# Altium footprint library General.PcbLib: 246 footprints (part 7 of 16)
Each footprint in its own frame and in the unit in brackets; x right, y up, seen from the top. Pads: shape width x height; smd on the part's side, far side on the other; paste and mask are expansions set on the pad; w line width, h text height; cw(c..) or ccw(c..) is an arc to the next point about the centre after c.
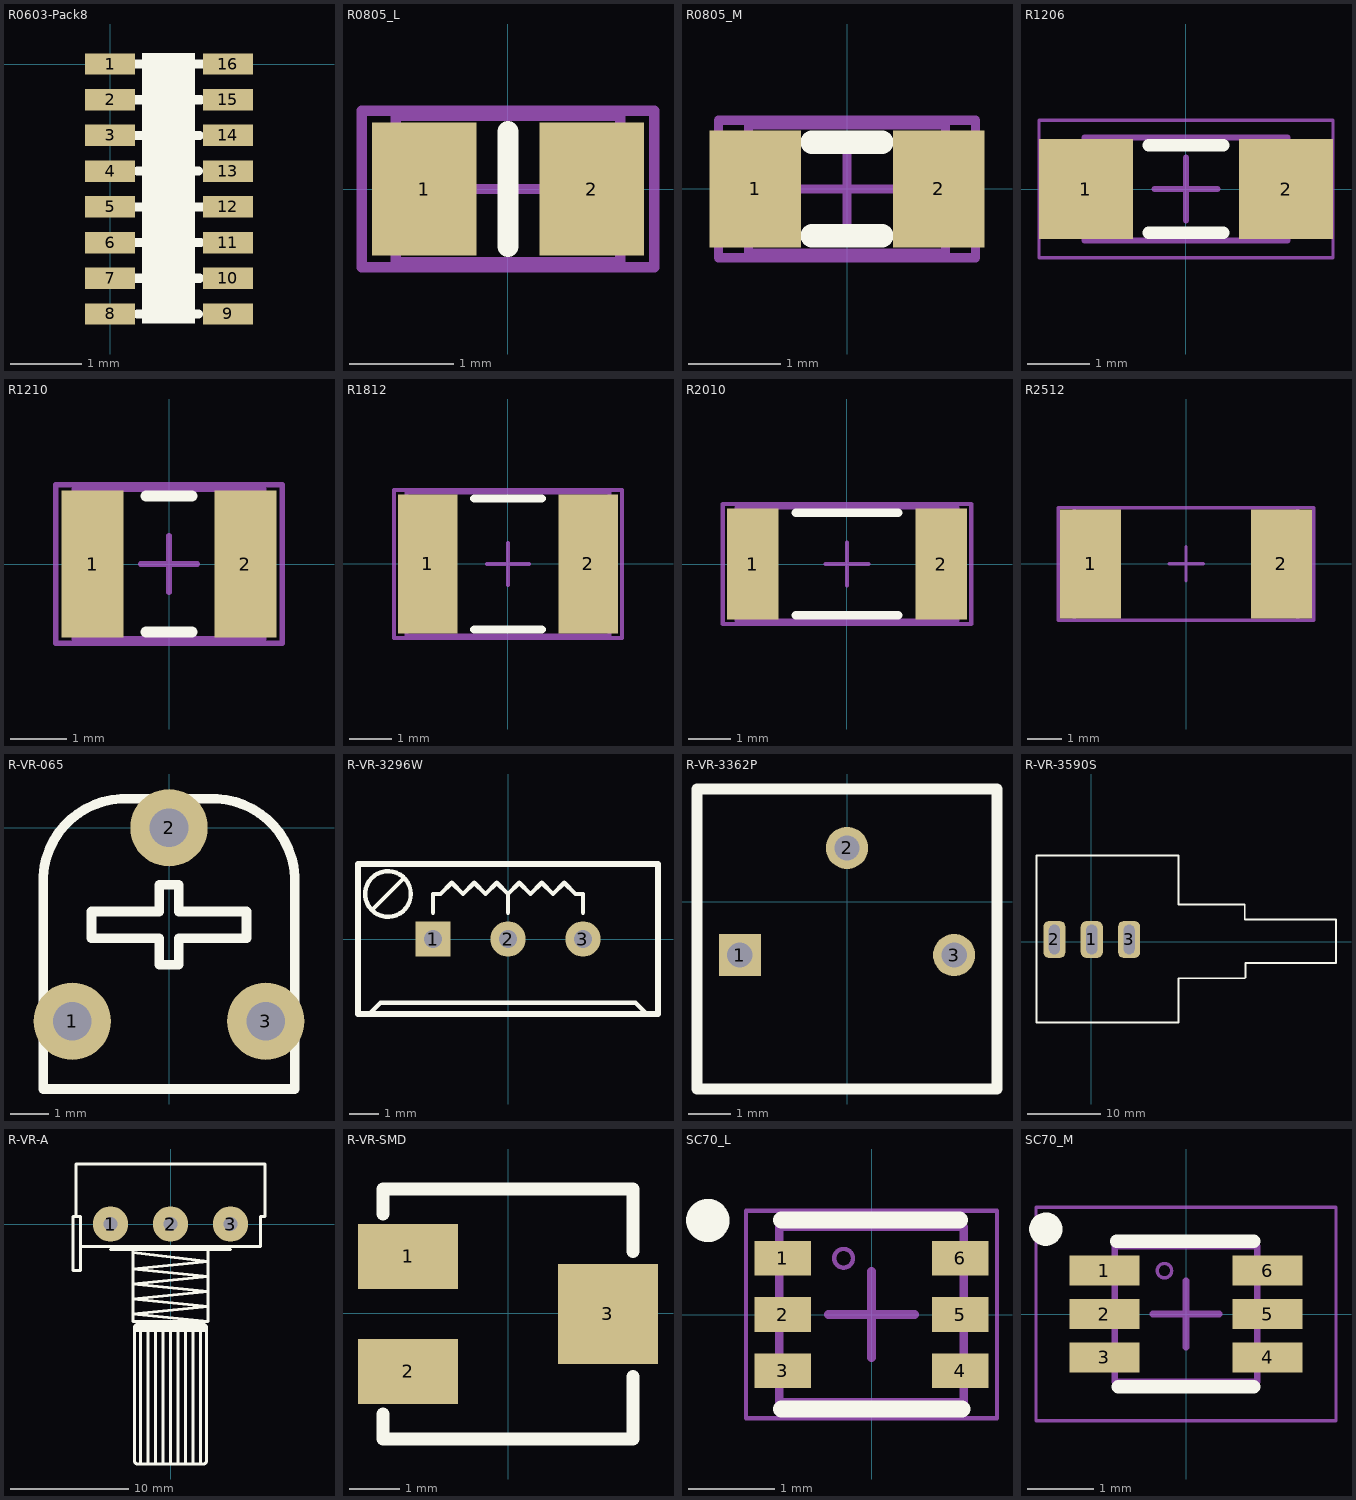
[diagram p6: the footprints below, top view; thin cyan lines are the x and y axes]

## R0603-Pack8 [mm] "排阻 8 0603"
pads (16):
  rect 0.7x0.3 smd: 1(0,0) 2(0,-0.5) 3(0,-1) 4(0,-1.5) 5(0,-2) 6(0,-2.5) 7(0,-3) 8(0,-3.5) 9(1.65,-3.5) 10(1.65,-3) 11(1.65,-2.5) 12(1.65,-2) 13(1.65,-1.5) 14(1.65,-1) 15(1.65,-0.5) 16(1.65,0)
Top Overlay:
  rectangle: 0.45,-3.632 1.19,0.157
  lines w0.127: 0.37,-3 1.25,-3 ; 0.37,-2.5 1.27,-2.5 ; 0.37,-2 1.28,-2 ; 0.37,-1 1.25,-1 ; 0.37,-0.5 1.27,-0.5 ; 0.37,0 1.28,0 ; 0.38,-3.5 1.24,-3.5 ; 0.38,-1.5 1.24,-1.5

## R0805_L [mm] "Chip Resistor, Body 2.0x1.2mm, IPC High Density"
height 0.7
pads (2):
  rect 1x1.27 smd: 1(-0.8,0) 2(0.8,0)
Top Overlay:
  lines w0.2: 0,-0.55 0,0.55
Mechanical 13:
  lines w0.1: -1.075,-0.7 1.075,-0.7 1.075,0.7 -1.075,0.7 -1.075,-0.7
Mechanical 15:
  lines w0.1: -0.5,0 0.5,0 ; 0,-0.5 0,0.5 ; -1.4,-0.75 1.4,-0.75 1.4,0.75 -1.4,0.75 -1.4,-0.75
3D body "User Library-Chip Resistor0805.step": height 0.5, standoff 0, extent -1,-0.6 1,0.6

## R0805_M [mm] "Chip Resistor, Body 2.0x1.2mm, IPC Medium Density"
height 0.7
pads (2):
  rect 1x1.27 smd: 1(-1,0) 2(1,0)
Top Overlay:
  lines w0.254: -0.381,-0.508 0.381,-0.508 ; -0.381,0.508 0.381,0.508
Mechanical 13:
  lines w0.1: -1.075,-0.7 -1.075,0.7 1.075,0.7 1.075,-0.7 -1.075,-0.7
Mechanical 15:
  lines w0.1: -0.5,0 0.5,0 ; 0,-0.5 0,0.5 ; -1.4,-0.75 -1.4,0.75 1.4,0.75 1.4,-0.75 -1.4,-0.75
3D body "User Library-Chip Resistor0805.step": height 0.5, standoff 0, extent -1,-0.6 1,0.6

## R1206 [mm] "Chip Resistor, 2-Leads, Body 3.20x1.60mm, IPC Medium Density"
height 0.6
pads (2):
  rect 1.5x1.6 smd: 1(-1.6,0) 2(1.6,0)
Top Overlay:
  lines w0.2: -0.6,-0.7 0.6,-0.7 ; -0.6,0.7 0.6,0.7
Mechanical 13:
  lines w0.1: -1.625,-0.825 -1.625,0.825 1.625,0.825 1.625,-0.825 -1.625,-0.825
Mechanical 15:
  lines w0.05: -2.35,-1.1 -2.35,1.1 2.35,1.1 2.35,-1.1 -2.35,-1.1
  lines w0.1: -0.5,0 0.5,0 ; 0,-0.5 0,0.5
3D body "User Library-Chip Resistor3216.step": height 0.6, standoff 0, extent -1.6,-0.8 1.6,0.8

## R1210 [mm] "Chip Resistor, Body 3.2x2.5mm, IPC High Density"
height 0.9
pads (2):
  rect 1.1x2.6 smd: 1(-1.35,0) 2(1.35,0)
Top Overlay:
  lines w0.2: -0.4,-1.2 0.4,-1.2 ; -0.4,1.2 0.4,1.2
Mechanical 13:
  lines w0.1: -1.675,-1.32 -1.675,1.32 1.675,1.32 1.675,-1.32 -1.675,-1.32
Mechanical 15:
  lines w0.1: -0.5,0 0.5,0 ; 0,-0.5 0,0.5 ; -2,-1.4 -2,1.4 2,1.4 2,-1.4 -2,-1.4
3D body "User Library-Chip Resistor1210.step": height 0.7, standoff 0, extent -1.6,-1.25 1.6,1.25

## R1812 [mm] "Chip Resistor,  Body 4.5x3.2mm, IPC High Density"
height 1.4
pads (2):
  rect 1.4x3.3 smd: 1(-1.9,0) 2(1.9,0)
Top Overlay:
  lines w0.2: -0.8,-1.55 0.8,-1.55 ; -0.8,1.55 0.8,1.55
Mechanical 13:
  lines w0.1: -2.4,-1.7 2.4,-1.7 2.4,1.7 -2.4,1.7 -2.4,-1.7
Mechanical 15:
  lines w0.1: -0.5,0 0.5,0 ; 0,-0.5 0,0.5 ; -2.7,-1.75 2.7,-1.75 2.7,1.75 -2.7,1.75 -2.7,-1.75
3D body "RESC4532X70N EIA 1812.step": height 0.7, standoff 0, extent -2.25,-1.6 2.25,1.6

## R2010 [mm] "Chip Resistor, Body 5.0x2.5mm, IPC High Density"
height 0.9
pads (2):
  rect 1.2x2.6 smd: 1(-2.2,0) 2(2.2,0)
Top Overlay:
  lines w0.2: -1.2,-1.2 1.2,-1.2 ; -1.2,1.2 1.2,1.2
Mechanical 13:
  lines w0.1: -2.575,-1.325 -2.575,1.325 2.575,1.325 2.575,-1.325 -2.575,-1.325
Mechanical 15:
  lines w0.1: -0.5,0 0.5,0 ; 0,-0.5 0,0.5 ; -2.9,-1.4 -2.9,1.4 2.9,1.4 2.9,-1.4 -2.9,-1.4
3D body "User Library-Chip Resistor2010.step": height 0.7, standoff 0, extent -2.5,-1.25 2.5,1.25

## R2512 [mm] "Chip Resistor, Body 6.4x3.2mm, IPC High Density"
pads (2):
  rect 1.8x3.2 smd: 1(-2.8,0) 2(2.8,0)
Mechanical 13:
  lines w0.1: -3.275,-1.662 -3.275,1.638 3.275,1.638 3.275,-1.662 -3.275,-1.662
Mechanical 15:
  lines w0.1: -0.5,0 0.5,0 ; 0,-0.5 0,0.5 ; -3.746,-1.651 -3.746,1.651 3.746,1.651 3.746,-1.651 -3.746,-1.651
3D body "User Library-Chip Resistor2512.step": height 0.7, standoff 0, extent -3.2,-1.6 3.2,1.6

## R-VR-065 [mil] "蓝白可调电位器"
pads (3):
  round 80 hole 39.37: 1(-100,-200)
  round 80 hole 40: 2(0,0) 3(100,-200)
Top Overlay:
  lines w10: -120,-220 -109.45,-209.45 ; -130,-270 130,-270 130,-50 ccw(c45,-55) 40,30 -40,30 ccw(c-45,-55) -130,-50 -130,-270 ; -80,-114.17 -80,-86.61 -10,-86.61 -10,-70 -10,-59.06 10,-59.06 10,-86.61 80,-86.61 80,-114.17 10,-114.17 10,-141.73 -10,-141.73 -10,-114.17 -80,-114.17
3D body "RM065.STEP": height 299.21, standoff -137.8, extent -127.95,-268.83 127.96,29.59

## R-VR-3296W [mm] "Potentiometer; 3 Leads"
height 10.3
pads (3):
  rect 1.2x1.2 hole 0.6: 1(-2.54,0)
  round 1.2 hole 0.6: 2(0,0) 3(2.54,0)
Top Overlay:
  circle w0.15: c-4.064,1.524 r0.773
  lines w0.15: -4.699,-2.54 -4.318,-2.159 4.318,-2.159 4.699,-2.54 ; -4.572,1.016 -3.556,2.032 ; -2.54,0.889 -2.54,1.524 -2.286,1.524 -1.905,1.905 -1.524,1.524 -1.143,1.905 -0.762,1.524 -0.381,1.905 0,1.524 ; 0,0.889 0,1.27 0,1.524 ; 2.54,0.889 2.54,1.524 2.286,1.524 1.905,1.905 1.524,1.524 1.143,1.905 0.762,1.524 0.381,1.905 0,1.524
  lines w0.2: -5.08,-2.54 5.08,-2.54 5.08,0 5.08,2.54 -5.08,2.54 -5.08,-2.54
3D body "3296W.STEP": height 11.5, standoff -3, extent -4.75,-2.54 4.75,2.46

## R-VR-3362P [mm]
pads (3):
  rect 1x1 hole 0.6: 1(-2.54,-1.27)
  round 1 hole 0.6: 2(0,1.27) 3(2.54,-1.27)
Top Overlay:
  lines w0.254: -3.556,-4.445 -3.556,2.667 3.556,2.667 3.556,-4.445 -3.556,-4.445
3D body "RP1.STEP": height 6.35, standoff -5.08, extent -3.556,-4.445 3.556,2.667

## R-VR-3590S [mm]
height 7.87
pads (3):
  rrect50% 3x5 hole 1.5 slot 4 at 90 deg: 1(0.1,0.3) 2(-4.98,0.3) 3(5.18,0.3)
Top Overlay:
  lines w0.254: 20.9,-4.965 11.9,-4.965 11.9,-10.965 -7.16,-10.965 -7.4,-10.965 -7.4,-4.365 -7.4,11.695 11.9,11.695 11.9,5.035 20.9,5.035 20.9,3 33.3,3 33.3,-2.9 21,-2.9 21,-4.865
3D body "3590S-2-502L.STEP": height 23.3, standoff -3.53, extent -7.06,-10.935 33.34,11.665

## R-VR-A [mm]
pads (3):
  round 3 hole 1.2: 1(-5.08,0) 2(0,0) 3(5.08,0)
Top Overlay:
  lines w0.254: -5.08,-2.159 5.08,-2.159 ; -3.175,-2.413 3.175,-3.175 -3.175,-3.81 3.175,-4.445 -3.175,-5.08 3.175,-5.715 -3.175,-6.35 3.175,-6.985 -3.175,-7.62 3.175,-8.255 ; -3.175,-2.159 -3.175,-8.255 3.175,-8.255 ; -3.048,-9.017 3.048,-9.017 ; -2.54,-20.32 -2.54,-9.144 ; -1.905,-20.32 -1.905,-9.017 ; -1.27,-20.32 -1.27,-9.017 ; -0.635,-20.32 -0.635,-9.017 ; 0,-20.32 0,-9.017 ; 0.635,-20.32 0.635,-9.017 ; 1.27,-20.32 1.27,-9.017 ; 1.905,-20.32 1.905,-9.017 ; 2.54,-20.32 2.54,-9.017 ; 3.175,-2.159 3.175,-8.255 ; -8.001,0.635 -7.62,0.635 -7.62,-1.905 ; -8.001,0.635 -8.001,5.08 8.001,5.08 8.001,0.635 7.62,0.635 7.62,0.508 7.62,-1.905 -7.62,-1.905 ; -8.001,0.635 -8.255,0.635 -8.255,-3.937 -7.62,-3.937 -7.62,-1.905 ; -3.048,-8.763 cw(c-2.794,-8.763) -2.794,-8.509 2.667,-8.509 2.794,-8.509 cw(c2.794,-8.763) 3.048,-8.763 ; -3.048,-8.763 -3.048,-20.066 ccw(c-2.794,-20.066) -2.794,-20.32 2.794,-20.32 ccw(c2.794,-20.066) 3.048,-20.066 3.048,-8.763 ; -3.048,-8.763 3.048,-8.763
3D body: height 2.54, standoff -2.54, extent -0.381,-0.254 0.381,0.381
3D body: height 2.54, standoff -2.54, extent 4.851,-0.343 5.613,0.292
3D body: height 2.54, standoff -2.54, extent -5.461,-0.254 -4.699,0.381
3D body: height 20.32, standoff 5.08, extent -7.62,-0.635 7.62,0.635
3D body: height 14.7, standoff 10.7, extent -1.746,-19.685 2.254,-8.255
3D body: height 15.49, standoff 9.91, extent -2.794,-8.255 2.794,-0.635
3D body: height 12.7, standoff 2.54, extent -7.56,-0.635 7.62,0.635
3D body: height 20.32, standoff 5.08, extent -7.65,0.635 7.59,4.699

## R-VR-SMD [mm] "贴片式滑动变阻器"
pads (3):
  rect 2x1.3 smd: 1(-2.008,1.138) 2(-2.008,-1.162)
  rect 2x2 smd: 3(1.992,-0.012)
Top Overlay:
  lines w0.254: -2.508,-2.012 -2.508,-2.512 2.492,-2.512 2.492,-1.262 ; -2.508,1.988 -2.508,2.488 2.492,2.488 2.492,1.238
3D body: height 2.67, standoff 0, extent -1.436,-1.436 1.436,1.436
3D body: height 3.05, standoff 0, extent -1.519,0.132 1.519,1.525
3D body: height 3.05, standoff 0, extent -1.519,-1.525 1.519,-0.132
3D body: height 0.64, standoff 0, extent 1.143,-0.889 2.921,0.889
3D body: height 0.64, standoff 0, extent -2.921,0.635 -1.143,1.651
3D body: height 0.64, standoff 0, extent -2.921,-1.651 -1.143,-0.635
3D body: height 2.54, standoff 0, extent -2.54,-2.413 2.54,2.413

## SC70_L [mm] "SOT23, 6-Leads, Body 2.0x1.25mm, Pitch 0.65mm, IPC High Density"
pads (6):
  rect 0.65x0.4 smd paste+0 mask+0.051: 1(-1.025,0.65) 2(-1.025,0) 3(-1.025,-0.65) 4(1.025,-0.65) 5(1.025,0) 6(1.025,0.65)
Top Overlay:
  circle w0.25: c-1.892,1.087 r0.125
  lines w0.2: -1.041,-1.092 1.041,-1.092 ; -1.041,1.092 1.016,1.092
Mechanical 13:
  lines w0.05: -0.432,0.65 cw(c-0.323,0.65) -0.215,0.65 cw(c-0.323,0.65) -0.432,0.65
  lines w0.1: -1.067,-1.016 -1.067,1.016 1.067,1.016 1.067,-1.016 -1.067,-1.016
Mechanical 15:
  lines w0.05: -1.45,-1.2 -1.45,1.2 1.45,1.2 1.45,-1.2 -1.45,-1.2
  lines w0.1: -0.5,0 0.5,0 ; 0,-0.5 0,0.5
3D body "INA199A1DCKR.stp": height 1, standoff 0, extent -1.05,-1 1.05,1

## SC70_M [mm] "SOT23, 6-Leads, Body 2.0x1.25mm, Pitch 0.65mm, IPC Low Density"
pads (6):
  rect 1.05x0.45 smd paste+0 mask+0.051: 1(-1.225,0.65) 2(-1.225,0) 3(-1.225,-0.65) 4(1.225,-0.65) 5(1.225,0) 6(1.225,0.65)
Top Overlay:
  circle w0.25: c-2.103,1.273 r0.125
  lines w0.2: -1.041,1.092 1.016,1.092 ; -1.016,-1.092 1.016,-1.092
Mechanical 13:
  lines w0.05: -0.432,0.65 ccw(c-0.323,0.65) -0.215,0.65 ccw(c-0.323,0.65) -0.432,0.65
  lines w0.1: -1.067,-1.016 1.067,-1.016 1.067,1.016 -1.067,1.016 -1.067,-1.016
Mechanical 15:
  lines w0.05: -2.25,-1.6 -2.25,1.6 2.25,1.6 2.25,-1.6 -2.25,-1.6
  lines w0.1: -0.5,0 0.5,0 ; 0,-0.5 0,0.5
3D body "INA199A1DCKR.stp": height 1, standoff 0, extent -1.05,-1 1.05,1